# Altium footprint library SG__PCB_HOLE_Connector.PcbLib: 174 footprints (part 3 of 11)
Each footprint in its own frame and in the unit in brackets; x right, y up, seen from the top. Pads: shape width x height; smd on the part's side, far side on the other; paste and mask are expansions set on the pad; w line width, h text height; cw(c..) or ccw(c..) is an arc to the next point about the centre after c.
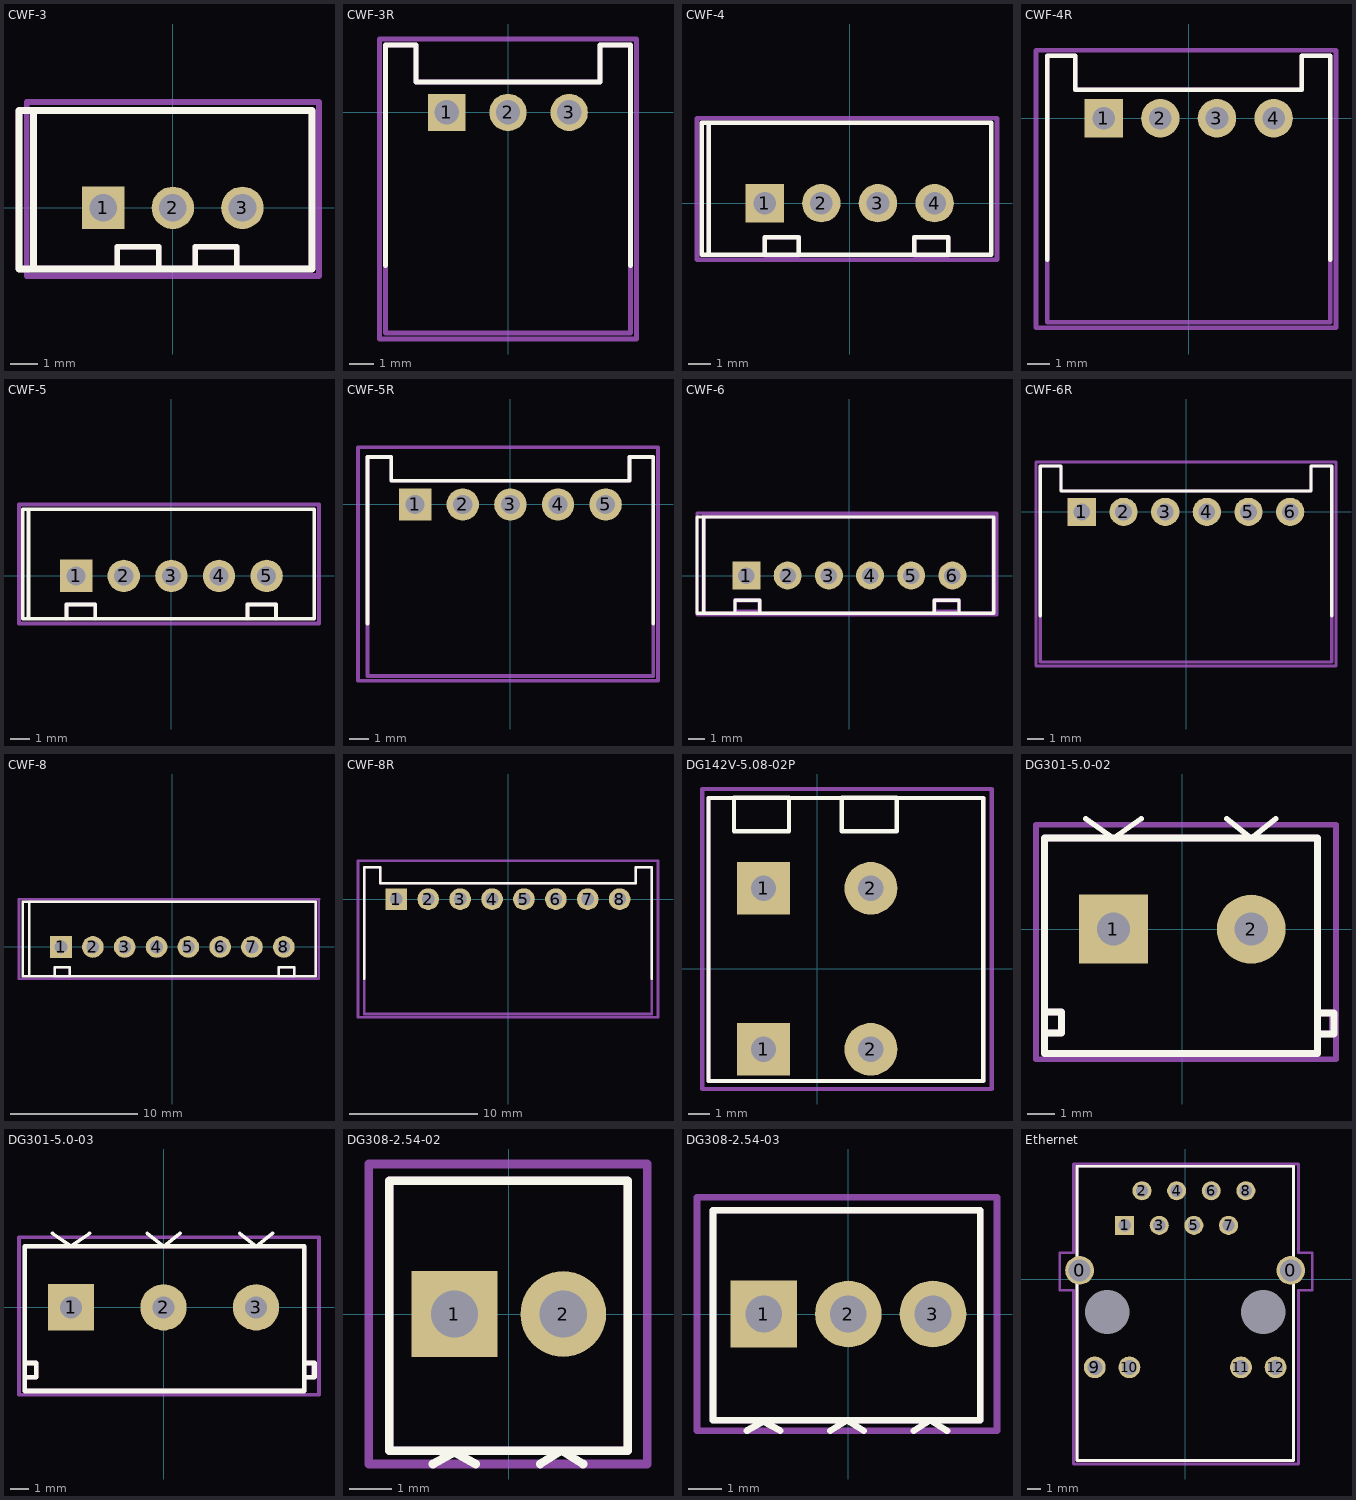
[diagram p2: the footprints below, top view; thin cyan lines are the x and y axes]

## CWF-3 [mil]
pads (3):
  rect 60x60 hole 39.37: 1(-98.43,0)
  round 60 hole 39.37: 2(0,0) 3(98.43,0)
Top Overlay:
  lines w7.87: -78.74,-84.65 -78.74,-55.12 -19.69,-55.12 -19.69,-84.65 ; 31.5,-84.65 31.5,-55.12 90.55,-55.12 90.55,-84.65
  lines w10: -196.85,-86.61 -217.52,-86.61 -217.52,137.8 -196.85,137.8 ; -196.85,-86.61 -196.85,137.8 ; -196.85,-86.61 196.85,-86.61 196.85,137.8 -196.85,137.8
Top Assembly:
  lines w7.87: -78.74,-86.61 -19.68,-86.61 -19.68,-55.12 -78.74,-55.12 -78.74,-86.61 ; 31.5,-86.61 90.55,-86.61 90.55,-55.12 31.5,-55.12 31.5,-86.61
  lines w10: -196.85,-86.61 -196.85,137.8 ; -196.85,-86.61 -217.52,-86.61 -217.52,137.8 -196.85,137.8 ; -196.85,-86.61 196.85,-86.61 196.85,137.8 -196.85,137.8
Top Courtyard:
  lines w7.87: -206.69,-96.46 206.69,-96.46 206.69,149.61 -206.69,149.61 -206.69,-96.46
3D body "CWF3.stp": height 311.02, standoff -51.18, extent -192.91,-88.58 200.79,135.83

## CWF-3R [mil]
pads (3):
  rect 60x60 hole 39.37: 1(-98.43,0)
  round 60 hole 39.37: 2(0,0) 3(98.43,0)
Top Overlay:
  lines w7.87: -196.85,-246.06 -196.85,108.27 -147.64,108.27 -147.64,49.21 147.64,49.21 147.64,108.27 196.85,108.27 196.85,-246.06
Top Assembly:
  lines w7.87: -196.85,-354.33 196.85,-354.33 196.85,108.27 147.64,108.27 147.64,49.21 -147.64,49.21 -147.64,108.27 -196.85,108.27 -196.85,-354.33
Top Courtyard:
  lines w7.87: -206.69,-364.17 206.69,-364.17 206.69,118.11 -206.69,118.11 -206.69,-364.17
3D body "CHU3.step": height 200.79, standoff 0, extent -181.1,-452.76 181.1,-149.61
3D body "User Library-DS1069-3 CWF-3R.step": height 226.38, standoff -137.8, extent -196.85,-349.61 196.85,103.15

## CWF-4 [mm]
pads (4):
  rect 1.7x1.7 hole 1 mask+0.05: 1(-3.75,0)
  round 1.7 hole 1 mask+0.05: 2(-1.25,0) 3(1.25,0) 4(3.75,0)
Top Overlay:
  lines w0.2: -6.234,-2.265 -6.234,3.556 ; -3.75,-2.25 -3.75,-1.5 -2.25,-1.5 -2.25,-2.25 ; 2.857,-2.15 2.857,-1.5 4.357,-1.5 4.357,-2.15 ; -6.543,-2.286 6.25,-2.286 6.25,3.556 -6.543,3.556 -6.543,-2.286
Top Assembly:
  lines w0.15: -6.25,-2.286 6.25,-2.286 6.25,3.556 -6.25,3.556 -6.25,-2.286
  lines w0.2: -3.743,-2.3 -2.243,-2.3 -2.243,-1.5 -3.743,-1.5 -3.743,-2.3 ; 2.857,-2.3 4.357,-2.3 4.357,-1.5 2.857,-1.5 2.857,-2.3
Top Courtyard:
  lines w0.2: -6.743,-2.5 6.507,-2.5 6.507,3.75 -6.743,3.75 -6.743,-2.5
3D body "CWF-4.step": height 7.1, standoff -3.4, extent -6.133,-2.194 6.267,3.556

## CWF-4R [mm]
pads (4):
  rect 1.7x1.7 hole 1 mask+0.05: 1(-3.75,0)
  round 1.7 hole 1 mask+0.05: 2(-1.25,0) 3(1.25,0) 4(3.75,0)
Top Overlay:
  lines w0.2: -6.25,-6.25 -6.25,2.75 -5,2.75 -5,1.25 5,1.25 5,2.75 6.25,2.75 6.25,-6.25
Top Assembly:
  lines w0.2: -6.25,-9 -6.25,2.75 -5,2.75 -5,1.25 5,1.25 5,2.75 6.25,2.75 6.25,-9 -6.25,-9
Top Courtyard:
  lines w0.2: -6.743,-9.25 6.507,-9.25 6.507,3 -6.743,3 -6.743,-9.25
3D body "CHU4.step": height 5.1, standoff 0, extent -5.85,-11.5 5.85,-3.8
3D body "User Library-DS1069-4 CWF-4R.step": height 5.75, standoff -3.5, extent -6.25,-8.88 6.25,2.62

## CWF-5 [mm]
pads (5):
  rect 1.7x1.7 hole 1 mask+0.05: 1(-5,0)
  round 1.7 hole 1 mask+0.05: 2(-2.5,0) 3(0,0) 4(2.5,0) 5(5,0)
Top Overlay:
  lines w0.2: -7.5,-2.25 -7.5,3.5 ; -5.5,-2.25 -5.5,-1.5 -4,-1.5 -4,-2.25 ; 3.995,-2.25 3.995,-1.5 5.5,-1.5 5.5,-2.25 ; -7.8,-2.25 -7.8,3.5 7.5,3.5 7.5,-2.25 -7.8,-2.25
Top Assembly:
  lines w0.15: -7.5,-2.25 -7.5,3.5 7.5,3.5 7.5,-2.25 -7.5,-2.25
  lines w0.2: -5.5,-2.25 -5.5,-1.5 -4,-1.5 -4,-2.25 ; 3.995,-2.25 3.995,-1.5 5.5,-1.5 5.5,-2.25
Top Courtyard:
  lines w0.2: -8,-2.5 7.75,-2.5 7.75,3.75 -8,3.75 -8,-2.5
3D body "CWF-5.step": height 7.2, standoff -3.3, extent -7.5,-2.25 7.5,3.5

## CWF-5R [mm]
pads (5):
  rect 1.7x1.7 hole 1 mask+0.05: 1(-5,0)
  round 1.7 hole 1 mask+0.05: 2(-2.5,0) 3(0,0) 4(2.5,0) 5(5,0)
Top Overlay:
  lines w0.2: -7.5,-6.25 -7.5,2.5 -6.25,2.5 -6.25,1.25 6.25,1.25 6.25,2.5 7.5,2.5 7.5,-6.25
Top Assembly:
  lines w0.2: -7.5,-9 7.5,-9 7.5,2.5 6.25,2.5 6.25,1.25 -6.25,1.25 -6.25,2.5 -7.5,2.5 -7.5,-9
Top Courtyard:
  lines w0.2: -8,-9.25 7.75,-9.25 7.75,3 -8,3 -8,-9.25
3D body "CHU5.step": height 5.1, standoff 0, extent -7.1,-11.5 7.1,-3.8
3D body "User Library-DS1069-5 CWF-5R.step": height 5.75, standoff -3.5, extent -7.5,-8.88 7.5,2.62

## CWF-6 [mm]
pads (6):
  rect 1.7x1.7 hole 1 mask+0.05: 1(-6.247,0)
  round 1.7 hole 1 mask+0.05: 2(-3.747,0) 3(-1.247,0) 4(1.253,0) 5(3.748,0) 6(6.248,0)
Top Overlay:
  lines w0.2: -8.832,-2.265 -8.832,3.556 ; -6.948,-2.25 -6.948,-1.5 -5.448,-1.5 -5.448,-2.25 ; 5.152,-2.25 5.152,-1.5 6.652,-1.5 6.652,-2.25 ; -9.247,-2.286 8.753,-2.286 8.753,3.556 -9.247,3.556 -9.247,-2.286
Top Assembly:
  lines w0.254: -8.847,-2.3 8.753,-2.3 8.753,3.6 -8.847,3.6 -8.847,-2.3 ; -6.947,-2.2 -5.447,-2.2 -5.447,-1.5 -6.947,-1.5 -6.947,-2.2 ; 5.153,-2.2 6.653,-2.2 6.653,-1.5 5.153,-1.5 5.153,-2.2
Top Courtyard:
  lines w0.2: -9.247,-2.4 8.953,-2.4 8.953,3.8 -9.247,3.8 -9.247,-2.4
3D body "User Library-CWF-6.step": height 7.2, standoff -3.3, extent -8.797,-2.15 8.703,3.6

## CWF-6R [mm]
pads (6):
  rect 1.7x1.7 hole 1 mask+0.05: 1(-6.247,0)
  round 1.7 hole 1 mask+0.05: 2(-3.747,0) 3(-1.247,0) 4(1.253,0) 5(3.748,0) 6(6.248,0)
Top Overlay:
  lines w0.2: -8.75,-6.25 -8.75,2.75 -7.5,2.75 -7.5,1.25 7.5,1.25 7.5,2.75 8.75,2.75 8.75,-6.25
Top Assembly:
  lines w0.2: -8.75,-9 -8.75,2.75 -7.5,2.75 -7.5,1.25 7.5,1.25 7.5,2.75 8.75,2.75 8.75,-9 -8.75,-9
Top Courtyard:
  lines w0.2: -9,-9.25 -9,3 9,3 9,-9.25 -9,-9.25
3D body "CHU6.step": height 5.1, standoff 0, extent -8.35,-11.75 8.35,-4.05
3D body "User Library-DS1069-6 CWF-6R.step": height 5.75, standoff -3.5, extent -8.747,-8.88 8.753,2.62

## CWF-8 [mm]
pads (8):
  rect 1.7x1.7 hole 1 mask+0.05: 1(-8.747,0)
  round 1.7 hole 1 mask+0.05: 2(-6.247,0) 3(-3.747,0) 4(-1.247,0) 5(1.248,0) 6(3.748,0) 7(6.248,0) 8(8.748,0)
Top Overlay:
  lines w0.2: -11.247,3.5 -11.232,-2.165 ; -9.247,-2.2 -9.247,-1.6 -8.047,-1.6 -8.047,-2.2 ; 8.353,-2.2 8.353,-1.6 9.553,-1.6 9.553,-2.2 ; -11.747,-2.286 11.253,-2.286 11.253,3.556 -11.747,3.556 -11.747,-2.286
Top Assembly:
  lines w0.15: 11.243,3.545 11.243,-2.286 -11.247,-2.286 -11.247,3.556 11.268,3.556
  lines w0.2: -9.247,-2.3 -8.047,-2.3 -8.047,-1.6 -9.247,-1.6 -9.247,-2.3 ; 8.353,-2.3 9.553,-2.3 9.553,-1.6 8.353,-1.6 8.353,-2.3
Top Courtyard:
  lines w0.2: 11.496,3.749 11.496,-2.486 11.482,-2.5 -12.047,-2.5 -12.047,3.75 11.513,3.75
3D body "User Library-DS1069-8 CWF-8.STEP": height 7, standoff -3.5, extent -11.227,-2.21 11.273,3.54

## CWF-8R [mm]
pads (8):
  rect 1.7x1.7 hole 1 mask+0.05: 1(-8.747,0)
  round 1.7 hole 1 mask+0.05: 2(-6.247,0) 3(-3.747,0) 4(-1.247,0) 5(1.248,0) 6(3.748,0) 7(6.248,0) 8(8.748,0)
Top Overlay:
  lines w0.2: -11.25,-6.25 -11.25,2.5 -10,2.5 -10,1.25 10,1.25 10,2.5 11.25,2.5 11.25,-6.25
Top Assembly:
  lines w0.2: -11.25,-9 11.25,-9 11.25,2.5 10,2.5 10,1.25 -10,1.25 -10,2.5 -11.25,2.5 -11.25,-9
Top Courtyard:
  lines w0.2: -11.75,-9.25 11.75,-9.25 11.75,3 -11.75,3 -11.75,-9.25
3D body "User Library-DS1069-8 CWF-8R.step": height 5.75, standoff -3.5, extent -11.25,-9 11.25,2.5
3D body "CHU8.step": height 4.6, standoff -0.5, extent -10.85,-12 10.85,-4.3

## DG142V-5.08-02P [mm] "PCB terminals 5mm"
pads (4):
  rect 2.5x2.5 hole 1.2: 1(-2.54,-3.81) 1(-2.54,3.81)
  round 2.5 hole 1.2: 2(2.54,-3.81) 2(2.54,3.81)
Top Overlay:
  lines w0.2: -5.14,-5.31 7.86,-5.31 7.86,8.09 -5.14,8.09 -5.14,-5.31 ; -3.94,6.51 -1.34,6.51 -1.34,8.11 -3.94,8.11 -3.94,6.51 ; 1.16,6.51 3.76,6.51 3.76,8.11 1.16,8.11 1.16,6.51
Top Assembly:
  lines w0.2: -5.14,-5.31 7.86,-5.31 7.86,8.09 -5.14,8.09 -5.14,-5.31
Top Courtyard:
  lines w0.2: -5.44,-5.69 8.26,-5.69 8.26,8.51 -5.44,8.51 -5.44,-5.69
3D body "DG142V-5.08-02P-1Y-1000A&Z(H).stp": height 14.6, standoff -3, extent -5.04,-5.39 7.82,8.01

## DG301-5.0-02 [mm] "PCB terminals 5mm"
pads (2):
  rect 2.5x2.5 hole 1.2: 1(-2.5,0)
  round 2.5 hole 1.2: 2(2.5,0)
Top Overlay:
  lines w0.2: -3.5,4 -2.5,3.3 -1.5,4 ; 1.616,4 2.5,3.3 3.384,4
  lines w0.254: -4.892,-3.772 -4.384,-3.772 -4.384,-3.01 -4.892,-3.01 ; 4.992,-3.8 5.5,-3.8 5.5,-3.038 4.992,-3.038 ; -5,-4.52 -5,3.3 4.9,3.3 4.9,-4.52 -5,-4.52
Top Assembly:
  lines w0.254: -4.892,-3.772 -4.384,-3.772 -4.384,-3.01 -4.892,-3.01 ; 4.946,-3.8 5.454,-3.8 5.454,-3.038 4.946,-3.038 ; -5,-4.52 -5,3.3 4.9,3.3 4.9,-4.52 -5,-4.52
Top Courtyard:
  lines w0.2: -5.312,-4.716 -5.312,3.784 5.576,3.784 5.576,-4.716 -5.312,-4.716
3D body "DG301-5.0-02P-1Y-00A(H).stp": height 10.4, standoff -3.9, extent -5.024,-4.52 5.576,3.08

## DG301-5.0-03 [mm] "PCB terminals 5mm"
pads (3):
  rect 2.5x2.5 hole 1.2: 1(-5,0)
  round 2.5 hole 1.2: 2(0,0) 3(5,0)
Top Overlay:
  lines w0.2: -6,4 -5,3.3 -4,4 ; -0.884,4 0,3.3 0.884,4 ; 4.116,4 5,3.3 5.884,4
  lines w0.254: -7.392,-3.772 -6.884,-3.772 -6.884,-3.01 -7.392,-3.01 ; 7.646,-3.772 8.154,-3.772 8.154,-3.01 7.646,-3.01 ; -7.5,-4.52 -7.5,3.3 7.6,3.3 7.6,-4.52 -7.5,-4.52
Top Assembly:
  lines w0.254: -7.392,-3.772 -6.884,-3.772 -6.884,-3.01 -7.392,-3.01 ; 7.6,-3.772 8.108,-3.772 8.108,-3.01 7.6,-3.01 ; -7.5,-4.52 -7.5,3.3 7.6,3.3 7.6,-4.52 -7.5,-4.52
Top Courtyard:
  lines w0.2: -7.812,-4.716 -7.812,3.784 8.4,3.784 8.4,-4.716 -7.812,-4.716
3D body "DG301-5.0-03P-1Y-00A(H).stp": height 10.4, standoff -3.9, extent -7.4,-4.3 8.2,3.3

## DG308-2.54-02 [mm]
pads (2):
  rect 2x2 hole 1.1: 1(-1.27,0)
  round 2 hole 1.1: 2(1.27,0)
Top Overlay:
  lines w0.2: -1.77,-3.5 -1.278,-3.226 -0.77,-3.5 ; 0.73,-3.5 1.23,-3.186 1.73,-3.5 ; -2.788,-3.186 2.772,-3.186 2.772,3.114 -2.788,3.114 -2.788,-3.186
Top Assembly:
  lines w0.2: -2.788,-3.186 2.772,-3.186 2.772,3.114 -2.788,3.114 -2.788,-3.186
Top Courtyard:
  lines w0.2: -3.27,-3.5 3.23,-3.5 3.23,3.5 -3.27,3.5 -3.27,-3.5
3D body "DG308-2.54-02.stp": height 8.55, standoff -3.6, extent -2.788,-3.186 2.772,3.114

## DG308-2.54-03 [mm]
pads (3):
  rect 2x2 hole 1.1: 1(-2.54,0)
  round 2 hole 1.1: 2(0,0) 3(2.54,0)
Top Overlay:
  lines w0.2: -3.04,-3.5 -2.548,-3.226 -2.04,-3.5 ; -0.54,-3.5 -0.04,-3.186 0.46,-3.5 ; 1.96,-3.5 2.46,-3.186 2.96,-3.5 ; -4.058,-3.186 3.96,-3.186 3.96,3.114 -4.058,3.114 -4.058,-3.186
Top Assembly:
  lines w0.2: -4.058,-3.186 3.96,-3.186 3.96,3.114 -4.058,3.114 -4.058,-3.186
Top Courtyard:
  lines w0.2: -4.54,-3.5 4.46,-3.5 4.46,3.5 -4.54,3.5 -4.54,-3.5
3D body "DG308-2.54-03.stp": height 8.55, standoff -3.6, extent -4.05,-3.2 4.05,3.1

## Ethernet [mm]
pads (16):
  round 2.1 hole 1.6: 0(-7.745,0.635) 0(7.745,0.635)
  round 0 hole 3.25: 0(-5.715,-2.415) 0(5.715,-2.415)
  rect 1.4x1.4 hole 0.9: 1(-4.44,3.935)
  round 1.4 hole 0.9: 2(-3.17,6.475) 3(-1.9,3.935) 4(-0.63,6.475) 5(0.64,3.935) 6(1.91,6.475) 7(3.18,3.935) 8(4.45,6.475)
  round 1.6 hole 1.1: 9(-6.63,-6.475) 10(-4.09,-6.475) 11(4.09,-6.475) 12(6.63,-6.475)
Top Overlay:
  lines w0.2: -7.94,-13.315 -7.94,8.275 0,8.275 7.94,8.275 7.94,-13.315 0,-13.315 -7.94,-13.315
Top Assembly:
  lines w0.2: -7.94,-13.315 0,-13.315 7.94,-13.315 7.94,8.275 0,8.275 -7.94,8.275 -7.94,-13.315
Top Courtyard:
  lines w0.2: -9.19,-0.815 -8.19,-0.815 -8.19,-13.565 8.06,-13.565 8.31,-13.565 8.31,-0.815 9.31,-0.815 9.31,1.935 8.31,1.935 8.31,8.435 -8.19,8.435 -8.19,1.935 -9.19,1.935 -9.19,-0.815